# Altium schematic symbol library Molex FFC - FPC Connectors (SMT).SchLib: 638 symbols (part 8 of 10) (continued)
## 104060-2017
designator J?
0.5 mm Pitch Easy-On(TM) Type FFC Connector, 2.5 mm Mated Height, Right Angle, ZIF, SMT, Bottom Contact, 20 Circuits, -20 to 85 degC, ELV and RoHS Compliant, Tape and Reel; Manufacturer: Molex; PartNumber: 104060-2017; Circuits (Loaded): 20; Current (Max per Contact): 0.5A; Entry Angle: 90degrees Angle; Mated Height: 2.50mm; Material - Metal: Phosphor Bronze; Material - Plating Mating: Gold; PCB Retention: Yes; Pitch - Mating Interface: 0.50mm; Stackable: No; Voltage (Max): 50V; PackageVersion: Rev. B, 05/2013; PackageReference: 104060-2017; PackageDescription: 20-Lead FFC Connector, Pitch 0.5 mm; Contact Position: Bottom; Material - Plating Termination: Gold; Number of Rows: 1; Orientation: Right Angle; Packing: Tape and Reel; Polarized to PCB: Yes; RoHS: TRUE; Mounting Technology: Surface Mount; ComponentLink1Description: Manufacturer URL; ComponentLink1URL: http://www.molex.com/molex/index.jsp; ComponentLink2Description: Datasheet; ComponentLink2URL: http://www.molex.com/webdocs/datasheets/pdf/en-us/1040602017_FFC_FPC_CONNECTORS.pdf; ComponentLink3Description: Package Specification; ComponentLink3URL: http://www.molex.com/pdm_docs/sd/1040602017_sd.pdf
footprint MOLX-104060-2017 (FFC Connector, 20-Leads, Right Angle, Pitch 0.5 mm, Mated Height 2.5 mm, SMT)
pins: 1, 2, 3, 4, 5, 6, 7, 8, 9, 10, 11, 12, 13, 14, 15, 16, 17, 18, 19, 20, MP1, MP2

## 104060-6017
designator J?
0.5 mm Pitch Easy-On(TM) Type FFC Connector, 2.5 mm Mated Height, Right Angle, ZIF, SMT, Bottom Contact, 60 Circuits, -20 to 85 degC, ELV and RoHS Compliant, Tape and Reel; Manufacturer: Molex; PartNumber: 104060-6017; Circuits (Loaded): 60; Current (Max per Contact): 0.5A; Entry Angle: 90degrees Angle; Mated Height: 2.50mm; Material - Metal: Phosphor Bronze; Material - Plating Mating: Gold; PCB Retention: Yes; Pitch - Mating Interface: 0.50mm; Stackable: No; Voltage (Max): 50V; PackageVersion: Rev. A, 06/2010; PackageReference: 104060-6017; PackageDescription: 60-Lead FFC Connector, Pitch 0.5 mm; Contact Position: Bottom; Material - Plating Termination: Gold; Number of Rows: 1; Orientation: Right Angle; Packing: Tape and Reel; Polarized to PCB: Yes; RoHS: TRUE; Mounting Technology: Surface Mount; ComponentLink1Description: Manufacturer URL; ComponentLink1URL: http://www.molex.com/molex/index.jsp; ComponentLink2Description: Datasheet; ComponentLink2URL: http://www.molex.com/webdocs/datasheets/pdf/en-us/1040606017_FFC_FPC_CONNECTORS.pdf; ComponentLink3Description: Package Specification; ComponentLink3URL: http://www.molex.com/pdm_docs/sd/1040606017_sd.pdf
footprint MOLX-104060-6017 (FFC Connector, 60-Leads, Right Angle, Pitch 0.5 mm, Mated Height 2.5 mm, SMT)
pins: 1, 2, 3, 4, 5, 6, 7, 8, 9, 10, 11, 12, 13, 14, 15, 16, 17, 18, 19, 20, 21, 22, 23, 24, 25, 26, 27, 28, 29, 30, 31, 32, 33, 34, 35, 36, 37, 38, 39, 40, 41, 42, 43, 44, 45, 46, 47, 48, 49, 50, 51, 52, 53, 54, 55, 56, 57, 58, 59, 60, MP1, MP2

## 104060-8017
designator J?
0.5 mm Pitch Easy-On(TM) Type FFC Connector, 2.5 mm Mated Height, Right Angle, ZIF, SMT, Bottom Contact, 80 Circuits, -20 to 85 degC, ELV and RoHS Compliant, Tape and Reel; Manufacturer: Molex; PartNumber: 104060-8017; Circuits (Loaded): 80; Current (Max per Contact): 0.5A; Entry Angle: 90degrees Angle; Mated Height: 2.50mm; Material - Metal: Phosphor Bronze; Material - Plating Mating: Gold; PCB Retention: Yes; Pitch - Mating Interface: 0.50mm; Stackable: No; Voltage (Max): 50V; PackageVersion: Rev. A, 06/2010; PackageReference: 104060-8017; PackageDescription: 80-Lead FFC Connector, Pitch 0.5 mm; Contact Position: Bottom; Material - Plating Termination: Gold; Number of Rows: 1; Orientation: Right Angle; Packing: Tape and Reel; Polarized to PCB: Yes; RoHS: TRUE; Mounting Technology: Surface Mount; ComponentLink1Description: Manufacturer URL; ComponentLink1URL: http://www.molex.com/molex/index.jsp; ComponentLink2Description: Datasheet; ComponentLink2URL: http://www.molex.com/webdocs/datasheets/pdf/en-us/1040608017_FFC_FPC_CONNECTORS.pdf; ComponentLink3Description: Package Specification; ComponentLink3URL: http://www.molex.com/pdm_docs/sd/1040608017_sd.pdf
footprint MOLX-104060-8017 (FFC Connector, 80-Leads, Right Angle, Pitch 0.5 mm, Mated Height 2.5 mm, SMT)
pins: 1, 2, 3, 4, 5, 6, 7, 8, 9, 10, 11, 12, 13, 14, 15, 16, 17, 18, 19, 20, 21, 22, 23, 24, 25, 26, 27, 28, 29, 30, 31, 32, 33, 34, 35, 36, 37, 38, 39, 40, 41, 42, 43, 44, 45, 46, 47, 48, 49, 50, 51, 52, 53, 54, 55, 56, 57, 58, 59, 60, 61, 62, 63, 64, 65, 66, 67, 68, 69, 70, 71, 72, 73, 74, 75, 76, 77, 78, 79, 80, MP1, MP2

## 104075-6817
designator J?
0.5 mm Pitch Easy-On(TM) Type FPC/FFC Connector, 1.5 mm Mated Height, Right Angle, ZIF, SMT, Bottom Contact, 68 Circuits, -25 to 85 degC, ELV and RoHS Compliant, Tape and Reel; Manufacturer: Molex; PartNumber: 104075-6817; Circuits (Loaded): 68; Contact Position: Top; Current (Max per Contact): 0.5A; Entry Angle: 90degrees Angle (Side Entry); Mated Height: 1.50mm; Material - Metal: Phosphor Bronze; Material - Plating Mating: Gold over Nickel; PCB Retention: None; Pitch - Mating Interface: 0.50mm; Polarized to PCB: No; Voltage (Max): 50V; PackageVersion: Rev. A, 11/2011; PackageReference: 104075-6817; PackageDescription: 68-Lead FPC/FFC Connector, Pitch 0.5 mm; Circuits (maximum): 68; Number of Rows: 1; Orientation: Right Angle; Packing: Tape and Reel; RoHS: TRUE; Stackable: No; Mounting Technology: Surface Mount; ComponentLink1Description: Manufacturer URL; ComponentLink1URL: http://www.molex.com/molex/index.jsp; ComponentLink2Description: Datasheet; ComponentLink2URL: http://www.molex.com/webdocs/datasheets/pdf/en-us/1040756817_FFC_FPC_CONNECTORS.pdf; ComponentLink3Description: Package Specification; ComponentLink3URL: http://www.molex.com/pdm_docs/sd/1040756817_sd.pdf
footprint MOLX-104075-6817 (FPC/FFC Connector, 68-Leads, Right Angle, Pitch 0.5 mm, Mated Height 1.5 mm, SMT)
pins: 1, 2, 3, 4, 5, 6, 7, 8, 9, 10, 11, 12, 13, 14, 15, 16, 17, 18, 19, 20, 21, 22, 23, 24, 25, 26, 27, 28, 29, 30, 31, 32, 33, 34, 35, 36, 37, 38, 39, 40, 41, 42, 43, 44, 45, 46, 47, 48, 49, 50, 51, 52, 53, 54, 55, 56, 57, 58, 59, 60, 61, 62, 63, 64, 65, 66, 67, 68, MP1, MP2

## 104083-9617
designator J?
0.5 mm Pitch Easy-On(TM) Type FPC/FFC Connector, 1.5 mm Mated Height, Right Angle, ZIF, SMT, Bottom Contact, 96 Circuits, -25 to 85 degC, ELV and RoHS Compliant, Tape and Reel; Manufacturer: Molex; PartNumber: 104083-9617; Circuits (Loaded): 96; Contact Position: Top; Current (Max per Contact): 0.5A; Entry Angle: 90degrees Angle (Side Entry); Mated Height: 1.50mm; Material - Metal: Phosphor Bronze; Material - Plating Mating: Gold over Nickel; PCB Retention: None; Pitch - Mating Interface: 0.50mm; Polarized to PCB: No; Voltage (Max): 50V; PackageVersion: Rev. A, 04/2012; PackageReference: 104083-9617; PackageDescription: 96-Lead FPC/FFC Connector, Pitch 0.5 mm; Circuits (maximum): 96; Number of Rows: 1; Orientation: Right Angle; Packing: Tape and Reel; RoHS: TRUE; Stackable: No; Mounting Technology: Surface Mount; ComponentLink1Description: Manufacturer URL; ComponentLink1URL: http://www.molex.com/molex/index.jsp; ComponentLink2Description: Datasheet; ComponentLink2URL: http://www.molex.com/webdocs/datasheets/pdf/en-us/1040839617_FFC_FPC_CONNECTORS.pdf; ComponentLink3Description: Package Specification; ComponentLink3URL: http://www.molex.com/pdm_docs/sd/1040839617_sd.pdf
footprint MOLX-104083-9617 (FPC/FFC Connector, 96-Leads, Right Angle, Pitch 0.5 mm, Mated Height 1.5 mm, SMT)
pins: 1, 2, 3, 4, 5, 6, 7, 8, 9, 10, 11, 12, 13, 14, 15, 16, 17, 18, 19, 20, 21, 22, 23, 24, 25, 26, 27, 28, 29, 30, 31, 32, 33, 34, 35, 36, 37, 38, 39, 40, 41, 42, 43, 44, 45, 46, 47, 48, 49, 50, 51, 52, 53, 54, 55, 56, 57, 58, 59, 60, 61, 62, 63, 64, 65, 66, 67, 68, 69, 70, 71, 72, 73, 74, 75, 76, 77, 78, 79, 80, 81, 82, 83, 84, 85, 86, 87, 88, 89, 90, 91, 92, 93, 94, 95, 96, MP1, MP2

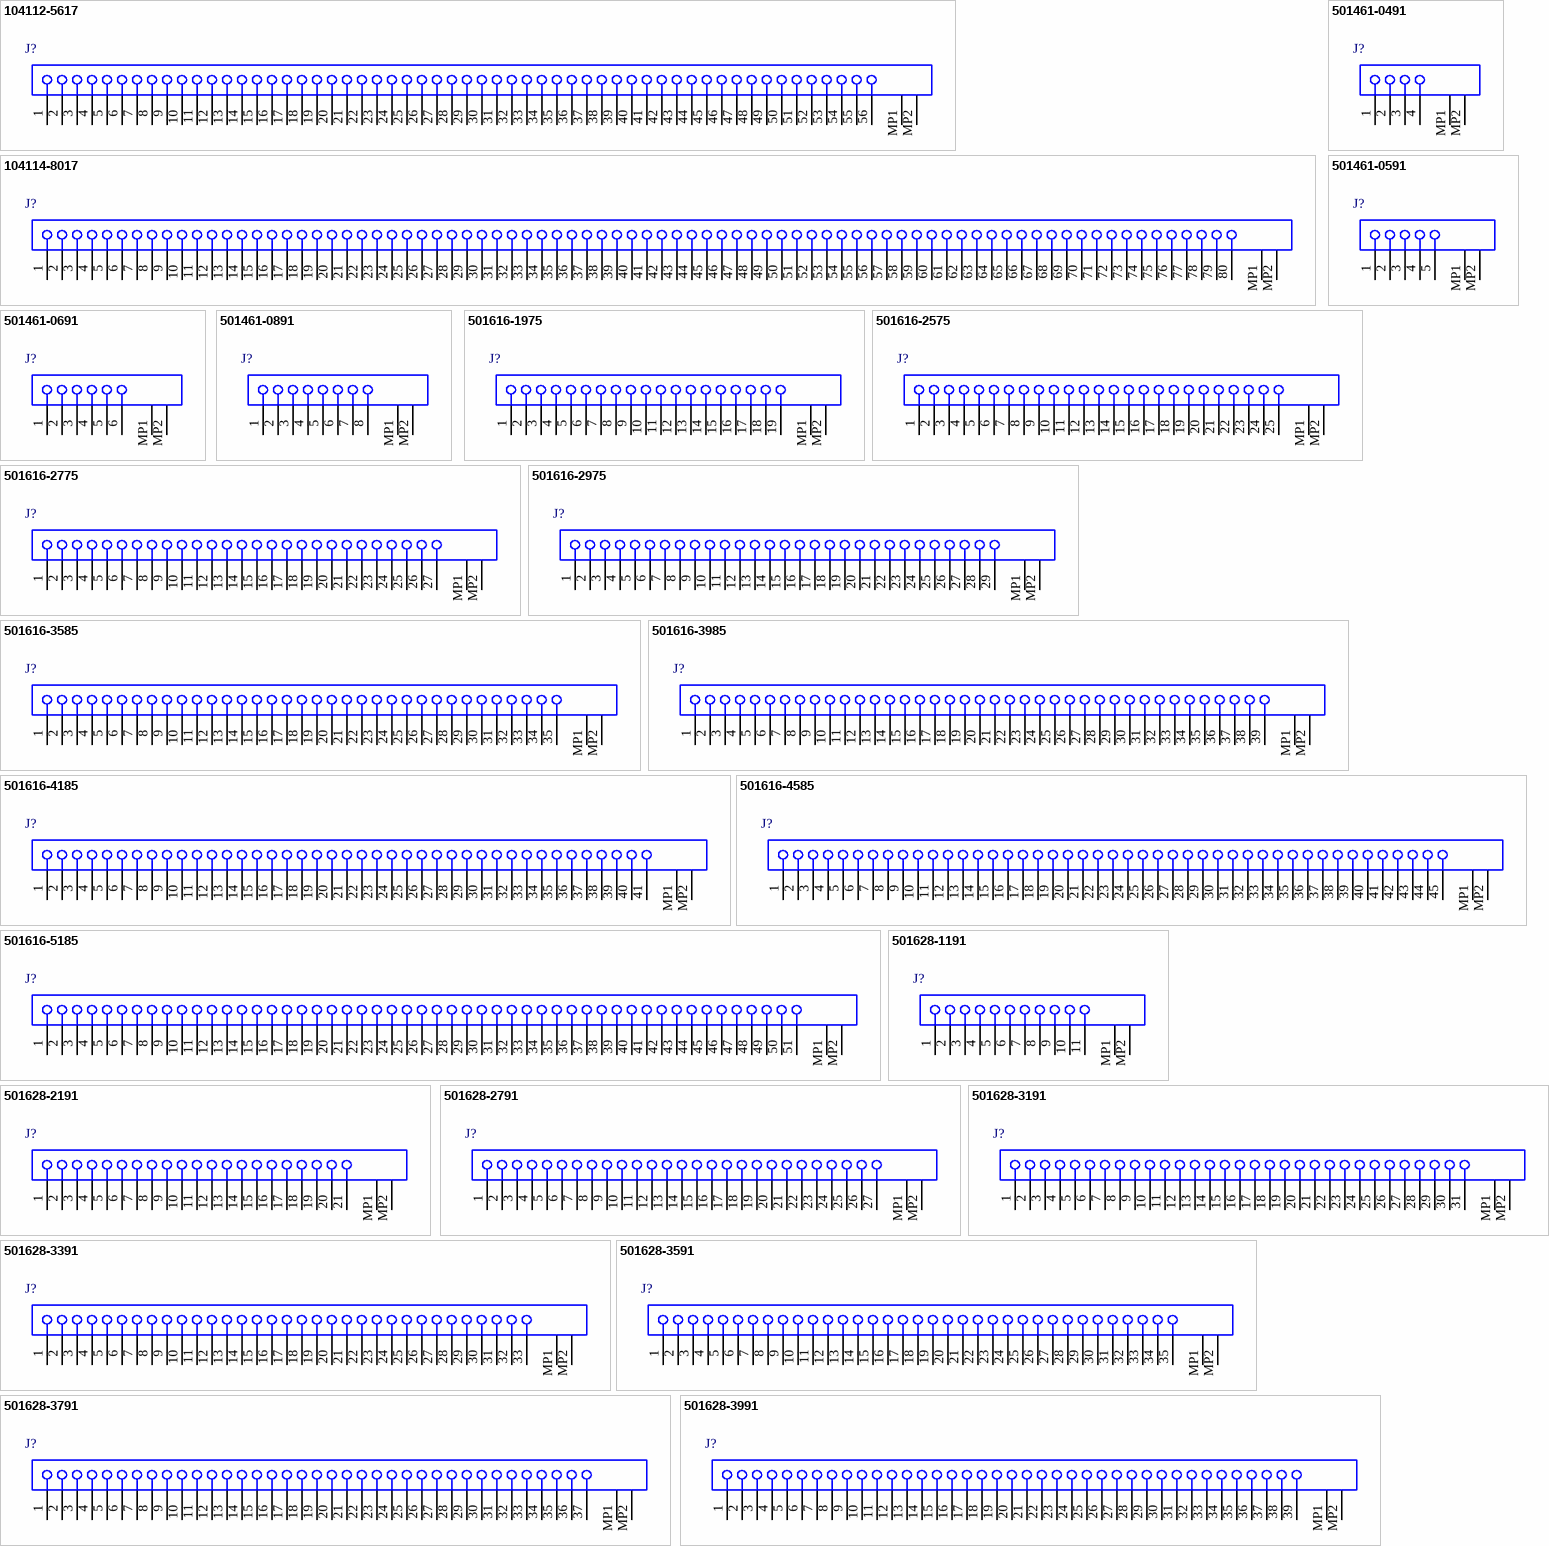
[diagram p15: symbols 104112-5617 to 501628-3991]

## 104112-5617
designator J?
0.5 mm Pitch Easy-On(TM) Type FPC/FFC Connector, 1.5 mm Mated Height, Right Angle, ZIF, SMT, Bottom Contact, 56 Circuits, -25 to 85 degC, ELV and RoHS Compliant, Tape and Reel; Manufacturer: Molex; PartNumber: 104112-5617; Circuits (Loaded): 56; Contact Position: Top; Current (Max per Contact): 0.5A; Entry Angle: 90degrees Angle (Side Entry); Mated Height: 1.50mm; Material - Metal: Phosphor Bronze; Material - Plating Mating: Gold over Nickel; PCB Retention: None; Pitch - Mating Interface: 0.50mm; Polarized to PCB: No; Voltage (Max): 50V; PackageVersion: Rev. A, 08/2012; PackageReference: 104112-5617; PackageDescription: 56-Lead FPC/FFC Connector, Pitch 0.5 mm; Circuits (maximum): 56; Number of Rows: 1; Orientation: Right Angle; Packing: Tape and Reel; RoHS: TRUE; Stackable: No; Mounting Technology: Surface Mount; ComponentLink1Description: Manufacturer URL; ComponentLink1URL: http://www.molex.com/molex/index.jsp; ComponentLink2Description: Datasheet; ComponentLink2URL: http://www.molex.com/webdocs/datasheets/pdf/en-us/1041125617_FFC_FPC_CONNECTORS.pdf; ComponentLink3Description: Package Specification; ComponentLink3URL: http://www.molex.com/pdm_docs/sd/1041125617_sd.pdf
footprint MOLX-104112-5617 (FPC/FFC Connector, 56-Leads, Right Angle, Pitch 0.5 mm, Mated Height 1.5 mm, SMT)
pins: 1, 2, 3, 4, 5, 6, 7, 8, 9, 10, 11, 12, 13, 14, 15, 16, 17, 18, 19, 20, 21, 22, 23, 24, 25, 26, 27, 28, 29, 30, 31, 32, 33, 34, 35, 36, 37, 38, 39, 40, 41, 42, 43, 44, 45, 46, 47, 48, 49, 50, 51, 52, 53, 54, 55, 56, MP1, MP2

## 104114-8017
designator J?
0.5 mm Pitch Easy-On(TM) Type FPC/FFC Connector, 1.5 mm Mated Height, Right Angle, ZIF, SMT, Bottom Contact, 80 Circuits, -25 to 85 degC, ELV and RoHS Compliant, Tape and Reel; Manufacturer: Molex; PartNumber: 104114-8017; Circuits (Loaded): 80; Contact Position: Top; Current (Max per Contact): 0.5A; Entry Angle: 90degrees Angle (Side Entry); Mated Height: 1.50mm; Material - Metal: Phosphor Bronze; Material - Plating Mating: Gold over Nickel; PCB Retention: None; Pitch - Mating Interface: 0.50mm; Polarized to PCB: No; Voltage (Max): 50V; PackageVersion: Rev. A, 12/2011; PackageReference: 104114-8017; PackageDescription: 80-Lead FPC/FFC Connector, Pitch 0.5 mm; Circuits (maximum): 80; Number of Rows: 1; Orientation: Right Angle; Packing: Tape and Reel; RoHS: TRUE; Stackable: No; Mounting Technology: Surface Mount; ComponentLink1Description: Manufacturer URL; ComponentLink1URL: http://www.molex.com/molex/index.jsp; ComponentLink2Description: Datasheet; ComponentLink2URL: http://www.molex.com/webdocs/datasheets/pdf/en-us/1041148017_FFC_FPC_CONNECTORS.pdf; ComponentLink3Description: Package Specification; ComponentLink3URL: http://www.molex.com/pdm_docs/sd/1041148017_sd.pdf
footprint MOLX-104114-8017 (FPC/FFC Connector, 80-Leads, Right Angle, Pitch 0.5 mm, Mated Height 1.5 mm, SMT)
pins: 1, 2, 3, 4, 5, 6, 7, 8, 9, 10, 11, 12, 13, 14, 15, 16, 17, 18, 19, 20, 21, 22, 23, 24, 25, 26, 27, 28, 29, 30, 31, 32, 33, 34, 35, 36, 37, 38, 39, 40, 41, 42, 43, 44, 45, 46, 47, 48, 49, 50, 51, 52, 53, 54, 55, 56, 57, 58, 59, 60, 61, 62, 63, 64, 65, 66, 67, 68, 69, 70, 71, 72, 73, 74, 75, 76, 77, 78, 79, 80, MP1, MP2

## 501461-0491
designator J?
0.5 mm Pitch Easy-On(TM) Type FPC Connector, 0.8 mm Mated Height, Right Angle, SMT, Bottom Contact, 4 Circuits, -40 to 85 degC, ELV and RoHS Compliant, Tape and Reel; Manufacturer: Molex; PartNumber: 501461-0491; Circuits (Loaded): 4; Current (Max per Contact): 0.3A; Durability (mating cycles max): 20; Entry Angle: 90degrees Angle; Mated Height: 0.80mm; Material - Metal: Copper Alloy; Material - Plating Mating: Gold; PCB Locator: No; PCB Retention: Yes; Pitch - Mating Interface: 0.50mm; Voltage (Max): 50V AC (RMS)/DC; PackageVersion: Rev. B, 01/2014; PackageReference: 501461-0491; PackageDescription: 4-Lead FPC Connector, Pitch 0.5 mm; Contact Position: Bottom; Material - Plating Termination: Gold; Number of Rows: 1; Orientation: Right Angle; Packing: Tape and Reel; Polarized to PCB: Yes; RoHS: TRUE; Stackable: No; Mounting Technology: Surface Mount; ComponentLink1Description: Manufacturer URL; ComponentLink1URL: http://www.molex.com/molex/index.jsp; ComponentLink2Description: Datasheet; ComponentLink2URL: http://www.molex.com/webdocs/datasheets/pdf/en-us/5014610491_FFC_FPC_CONNECTORS.pdf; ComponentLink3Description: Package Specification; ComponentLink3URL: http://www.molex.com/pdm_docs/sd/5014610491_sd.pdf
footprint MOLX-501461-0491 (FPC Connector, 4-Leads, Right Angle, Pitch 0.5 mm, Mated Height 0.8 mm, SMT)
pins: 1, 2, 3, 4, MP1, MP2

## 501461-0591
designator J?
0.5 mm Pitch Easy-On(TM) Type FPC Connector, 0.8 mm Mated Height, Right Angle, SMT, Bottom Contact, 5 Circuits, -40 to 85 degC, ELV and RoHS Compliant, Tape and Reel; Manufacturer: Molex; PartNumber: 501461-0591; Circuits (Loaded): 5; Current (Max per Contact): 0.3A; Durability (mating cycles max): 20; Entry Angle: 90degrees Angle; Mated Height: 0.80mm; Material - Metal: Copper Alloy; Material - Plating Mating: Gold; PCB Locator: No; PCB Retention: Yes; Pitch - Mating Interface: 0.50mm; Voltage (Max): 50V AC (RMS)/DC; PackageVersion: Rev. B, 01/2014; PackageReference: 501461-0591; PackageDescription: 5-Lead FPC Connector, Pitch 0.5 mm; Contact Position: Bottom; Material - Plating Termination: Gold; Number of Rows: 1; Orientation: Right Angle; Packing: Tape and Reel; Polarized to PCB: Yes; RoHS: TRUE; Stackable: No; Mounting Technology: Surface Mount; ComponentLink1Description: Manufacturer URL; ComponentLink1URL: http://www.molex.com/molex/index.jsp; ComponentLink2Description: Datasheet; ComponentLink2URL: http://www.molex.com/webdocs/datasheets/pdf/en-us/5014610591_FFC_FPC_CONNECTORS.pdf; ComponentLink3Description: Package Specification; ComponentLink3URL: http://www.molex.com/pdm_docs/sd/5014610591_sd.pdf
footprint MOLX-501461-0591 (FPC Connector, 5-Leads, Right Angle, Pitch 0.5 mm, Mated Height 0.8 mm, SMT)
pins: 1, 2, 3, 4, 5, MP1, MP2

## 501461-0691
designator J?
0.5 mm Pitch Easy-On(TM) Type FPC Connector, 0.8 mm Mated Height, Right Angle, SMT, Bottom Contact, 6 Circuits, -40 to 85 degC, ELV and RoHS Compliant, Tape and Reel; Manufacturer: Molex; PartNumber: 501461-0691; Circuits (Loaded): 6; Current (Max per Contact): 0.3A; Durability (mating cycles max): 20; Entry Angle: 90degrees Angle; Mated Height: 0.80mm; Material - Metal: Copper Alloy; Material - Plating Mating: Gold; PCB Locator: No; PCB Retention: Yes; Pitch - Mating Interface: 0.50mm; Voltage (Max): 50V AC (RMS)/DC; PackageVersion: Rev. B, 01/2014; PackageReference: 501461-0691; PackageDescription: 6-Lead FPC Connector, Pitch 0.5 mm; Contact Position: Bottom; Material - Plating Termination: Gold; Number of Rows: 1; Orientation: Right Angle; Packing: Tape and Reel; Polarized to PCB: Yes; RoHS: TRUE; Stackable: No; Mounting Technology: Surface Mount; ComponentLink1Description: Manufacturer URL; ComponentLink1URL: http://www.molex.com/molex/index.jsp; ComponentLink2Description: Datasheet; ComponentLink2URL: http://www.molex.com/webdocs/datasheets/pdf/en-us/5014610691_FFC_FPC_CONNECTORS.pdf; ComponentLink3Description: Package Specification; ComponentLink3URL: http://www.molex.com/pdm_docs/sd/5014610691_sd.pdf
footprint MOLX-501461-0691 (FPC Connector, 6-Leads, Right Angle, Pitch 0.5 mm, Mated Height 0.8 mm, SMT)
pins: 1, 2, 3, 4, 5, 6, MP1, MP2

## 501461-0891
designator J?
0.5 mm Pitch Easy-On(TM) Type FPC Connector, 0.8 mm Mated Height, Right Angle, SMT, Bottom Contact, 8 Circuits, -40 to 85 degC, ELV and RoHS Compliant, Tape and Reel; Manufacturer: Molex; PartNumber: 501461-0891; Circuits (Loaded): 8; Current (Max per Contact): 0.3A; Durability (mating cycles max): 20; Entry Angle: 90degrees Angle; Mated Height: 0.80mm; Material - Metal: Copper Alloy; Material - Plating Mating: Gold; PCB Locator: No; PCB Retention: Yes; Pitch - Mating Interface: 0.50mm; Voltage (Max): 50V AC (RMS)/DC; PackageVersion: Rev. B, 01/2014; PackageReference: 501461-0891; PackageDescription: 8-Lead FPC Connector, Pitch 0.5 mm; Contact Position: Bottom; Material - Plating Termination: Gold; Number of Rows: 1; Orientation: Right Angle; Packing: Tape and Reel; Polarized to PCB: Yes; RoHS: TRUE; Stackable: No; Mounting Technology: Surface Mount; ComponentLink1Description: Manufacturer URL; ComponentLink1URL: http://www.molex.com/molex/index.jsp; ComponentLink2Description: Datasheet; ComponentLink2URL: http://www.molex.com/webdocs/datasheets/pdf/en-us/5014610891_FFC_FPC_CONNECTORS.pdf; ComponentLink3Description: Package Specification; ComponentLink3URL: http://www.molex.com/pdm_docs/sd/5014610891_sd.pdf
footprint MOLX-501461-0891 (FPC Connector, 8-Leads, Right Angle, Pitch 0.5 mm, Mated Height 0.8 mm, SMT)
pins: 1, 2, 3, 4, 5, 6, 7, 8, MP1, MP2

## 501616-1975
designator J?
0.3 mm Pitch Easy-On(TM) Type FPC Connector, 1.1 mm Mated Height, Right Angle, ZIF, SMT, Top Contact, 19 Circuits, -40 to 85 degC, ELV and RoHS Compliant, Tape and Reel; Manufacturer: Molex; PartNumber: 501616-1975; Circuits (Loaded): 19; Current (Max per Contact): 0.2A; Durability (mating cycles max): 10; Entry Angle: 90degrees Angle; Mated Height: 1.10mm; Material - Metal: Copper Alloy; Material - Plating Mating: Gold; PCB Locator: No; PCB Retention: Yes; Pitch - Mating Interface: 0.30mm; Voltage (Max): 50V AC (RMS)/DC; PackageVersion: Rev. 0, 05/2007; PackageReference: 501616-1975; PackageDescription: 19-Lead FPC Connector, Pitch 0.3 mm; Contact Position: Top; Number of Rows: 1; Orientation: Right Angle; Packing: Tape and Reel; Polarized to PCB: Yes; RoHS: TRUE; Stackable: No; Mounting Technology: Surface Mount; ComponentLink1Description: Manufacturer URL; ComponentLink1URL: http://www.molex.com/molex/index.jsp; ComponentLink2Description: Datasheet; ComponentLink2URL: http://www.molex.com/webdocs/datasheets/pdf/en-us/5016161975_FFC_FPC_CONNECTORS.pdf; ComponentLink3Description: Package Specification; ComponentLink3URL: http://www.molex.com/pdm_docs/sd/5016161975_sd.pdf
footprint MOLX-501616-1975 (FPC Connector, 19-Leads, Right Angle, Pitch 0.3 mm, Mated Height 1.1 mm, SMT)
pins: 1, 2, 3, 4, 5, 6, 7, 8, 9, 10, 11, 12, 13, 14, 15, 16, 17, 18, 19, MP1, MP2

## 501616-2575
designator J?
0.3 mm Pitch Easy-On(TM) Type FPC Connector, 1.1 mm Mated Height, Right Angle, ZIF, SMT, Top Contact, 25 Circuits, -40 to 85 degC, ELV and RoHS Compliant, Tape and Reel; Manufacturer: Molex; PartNumber: 501616-2575; Circuits (Loaded): 25; Current (Max per Contact): 0.2A; Durability (mating cycles max): 10; Entry Angle: 90degrees Angle; Mated Height: 1.10mm; Material - Metal: Copper Alloy; Material - Plating Mating: Gold; PCB Locator: No; PCB Retention: Yes; Pitch - Mating Interface: 0.30mm; Voltage (Max): 50V AC (RMS)/DC; PackageVersion: Rev. 0, 05/2007; PackageReference: 501616-2575; PackageDescription: 25-Lead FPC Connector, Pitch 0.3 mm; Contact Position: Top; Number of Rows: 1; Orientation: Right Angle; Packing: Tape and Reel; Polarized to PCB: Yes; RoHS: TRUE; Stackable: No; Mounting Technology: Surface Mount; ComponentLink1Description: Manufacturer URL; ComponentLink1URL: http://www.molex.com/molex/index.jsp; ComponentLink2Description: Datasheet; ComponentLink2URL: http://www.molex.com/webdocs/datasheets/pdf/en-us/5016162575_FFC_FPC_CONNECTORS.pdf; ComponentLink3Description: Package Specification; ComponentLink3URL: http://www.molex.com/pdm_docs/sd/5016162575_sd.pdf
footprint MOLX-501616-2575 (FPC Connector, 25-Leads, Right Angle, Pitch 0.3 mm, Mated Height 1.1 mm, SMT)
pins: 1, 2, 3, 4, 5, 6, 7, 8, 9, 10, 11, 12, 13, 14, 15, 16, 17, 18, 19, 20, 21, 22, 23, 24, 25, MP1, MP2

## 501616-2775
designator J?
0.3 mm Pitch Easy-On(TM) Type FPC Connector, 1.1 mm Mated Height, Right Angle, ZIF, SMT, Top Contact, 27 Circuits, -40 to 85 degC, ELV and RoHS Compliant, Tape and Reel; Manufacturer: Molex; PartNumber: 501616-2775; Circuits (Loaded): 27; Current (Max per Contact): 0.2A; Durability (mating cycles max): 10; Entry Angle: 90degrees Angle; Mated Height: 1.10mm; Material - Metal: Copper Alloy; Material - Plating Mating: Gold; PCB Locator: No; PCB Retention: Yes; Pitch - Mating Interface: 0.30mm; Voltage (Max): 50V AC (RMS)/DC; PackageVersion: Rev. 0, 05/2007; PackageReference: 501616-2775; PackageDescription: 27-Lead FPC Connector, Pitch 0.3 mm; Contact Position: Top; Number of Rows: 1; Orientation: Right Angle; Packing: Tape and Reel; Polarized to PCB: Yes; RoHS: TRUE; Stackable: No; Mounting Technology: Surface Mount; ComponentLink1Description: Manufacturer URL; ComponentLink1URL: http://www.molex.com/molex/index.jsp; ComponentLink2Description: Datasheet; ComponentLink2URL: http://www.molex.com/webdocs/datasheets/pdf/en-us/5016162775_FFC_FPC_CONNECTORS.pdf; ComponentLink3Description: Package Specification; ComponentLink3URL: http://www.molex.com/pdm_docs/sd/5016162775_sd.pdf
footprint MOLX-501616-2775 (FPC Connector, 27-Leads, Right Angle, Pitch 0.3 mm, Mated Height 1.1 mm, SMT)
pins: 1, 2, 3, 4, 5, 6, 7, 8, 9, 10, 11, 12, 13, 14, 15, 16, 17, 18, 19, 20, 21, 22, 23, 24, 25, 26, 27, MP1, MP2

## 501616-2975
designator J?
0.3 mm Pitch Easy-On(TM) Type FPC Connector, 1.1 mm Mated Height, Right Angle, ZIF, SMT, Top Contact, 29 Circuits, -40 to 85 degC, ELV and RoHS Compliant, Tape and Reel; Manufacturer: Molex; PartNumber: 501616-2975; Circuits (Loaded): 29; Current (Max per Contact): 0.2A; Durability (mating cycles max): 10; Entry Angle: 90degrees Angle; Mated Height: 1.10mm; Material - Metal: Copper Alloy; Material - Plating Mating: Gold; PCB Locator: No; PCB Retention: Yes; Pitch - Mating Interface: 0.30mm; Voltage (Max): 50V AC (RMS)/DC; PackageVersion: Rev. 0, 05/2007; PackageReference: 501616-2975; PackageDescription: 29-Lead FPC Connector, Pitch 0.3 mm; Contact Position: Top; Number of Rows: 1; Orientation: Right Angle; Packing: Tape and Reel; Polarized to PCB: Yes; RoHS: TRUE; Stackable: No; Mounting Technology: Surface Mount; ComponentLink1Description: Manufacturer URL; ComponentLink1URL: http://www.molex.com/molex/index.jsp; ComponentLink2Description: Datasheet; ComponentLink2URL: http://www.molex.com/webdocs/datasheets/pdf/en-us/5016162975_FFC_FPC_CONNECTORS.pdf; ComponentLink3Description: Package Specification; ComponentLink3URL: http://www.molex.com/pdm_docs/sd/5016162975_sd.pdf
footprint MOLX-501616-2975 (FPC Connector, 29-Leads, Right Angle, Pitch 0.3 mm, Mated Height 1.1 mm, SMT)
pins: 1, 2, 3, 4, 5, 6, 7, 8, 9, 10, 11, 12, 13, 14, 15, 16, 17, 18, 19, 20, 21, 22, 23, 24, 25, 26, 27, 28, 29, MP1, MP2
